# Altium footprint library CUSTOM PCB.PcbLib: 404 footprints (part 2 of 26)
Each footprint in its own frame and in the unit in brackets; x right, y up, seen from the top. Pads: shape width x height; smd on the part's side, far side on the other; paste and mask are expansions set on the pad; w line width, h text height; cw(c..) or ccw(c..) is an arc to the next point about the centre after c.
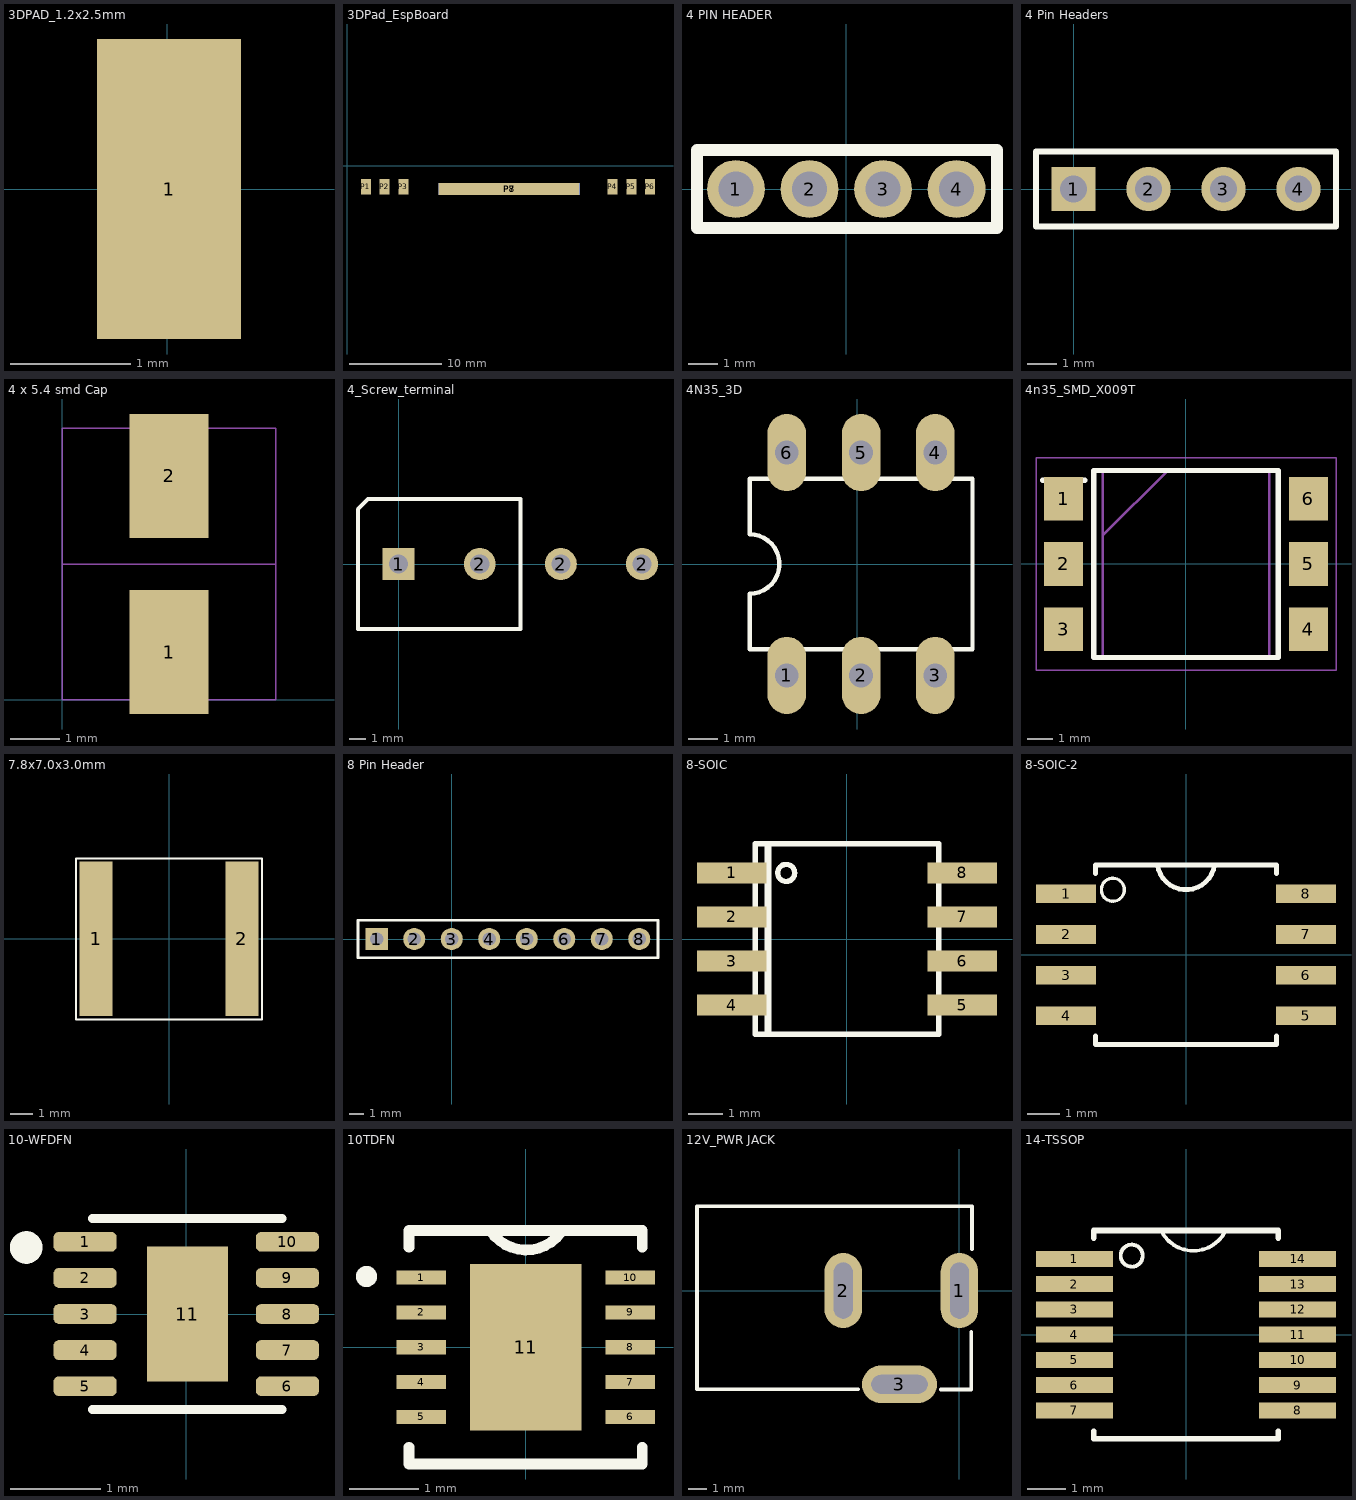
[diagram p1: the footprints below, top view; thin cyan lines are the x and y axes]

## 3DPAD_1.2x2.5mm [mm] "3D PAD_1.2x2.5mm"
pads (1):
  rect 1.2x2.5 smd: 1(0.015,0)

## 3DPad_EspBoard [mil]
pads (8):
  rect 43.31x66.93 smd: P1(80,-90) P2(160,-90) P3(240,-90) P4(1130,-90) P5(1210,-90) P6(1290,-90)
  rect 600x50 smd far side: P7(690,-100)
  rect 600x50 smd: P8(690,-100)
3D body: height 5, standoff 0, extent 380,-130 1000,-70
3D body: height 5, standoff 0, extent 210,-130 270,-50
3D body: height 5, standoff 0, extent 1260,-130 1320,-50
3D body: height 5, standoff 0, extent 1180,-130 1240,-50
3D body: height 5, standoff 0, extent 1100,-130 1160,-50
3D body: height 5, standoff 0, extent 130,-130 190,-50
3D body: height 5, standoff 0, extent 50,-130 110,-50
3D body: height 5, standoff 0, extent 380,-130 1000,-70
3D body: height 5, standoff 0, extent 380,-130 1000,-70

## 4 PIN HEADER [mm]
pads (4):
  round 2 hole 1.2: 1(-3.81,0) 2(-1.27,0) 3(1.27,0) 4(3.81,0)
Top Overlay:
  lines w0.4: -5.156,-1.346 5.207,-1.346 5.207,1.346 -5.156,1.346 -5.156,-1.346

## 4 Pin Headers [mm] "2.54"
pads (4):
  rect 1.5x1.5 hole 0.9: 1(0,0)
  round 1.5 hole 0.9: 2(2.54,0) 3(5.08,0) 4(7.62,0)
Top Overlay:
  lines w0.2: -1.27,-1.27 -1.27,1.27 8.89,1.27 8.89,-1.27 -1.27,-1.27
3D body "User Library-2PIN.SLDPRT": height 8, standoff -3, extent 3.81,-1.27 8.89,1.27
3D body "User Library-2PIN.SLDPRT": height 8, standoff -3, extent -1.27,-1.27 3.81,1.27

## 4 x 5.4 smd Cap [mm] "SMD_Polar_Cap"
pads (2):
  rect 1.6x2.5 smd: 1(2.159,0.965) 2(2.159,4.521)
Mechanical 4:
  lines w0.025: 0,2.743 4.318,2.743 ; 0,0 4.318,0 4.318,5.486 0,5.486 0,0
3D body "User Library-4x5_4.STEP": height 5.7, standoff 0, extent 0.035,0.068 4.335,5.368

## 4_Screw_terminal [mm]
pads (4):
  rect 2x2 hole 1.2: 1(0,0)
  round 2 hole 1.2: 2(5.08,0) 2(10.16,0) 2(15.24,0)
Top Overlay:
  lines w0.254: -2.54,-4.064 -2.54,3.429 -1.905,4.064 7.62,4.064 7.62,-4.064 -2.54,-4.064
3D body: height 0.25, standoff 0, extent 2.54,0 2.54,0

## 4N35_3D [mil] "4n35 including 3d model"
pads (6):
  oval 52x104 hole 32: 1(-95,-150) 2(5,-150) 3(105,-150) 4(105,150) 5(5,150) 6(-95,150)
Top Overlay:
  lines w6: -145,-115 155,-115 155,115 -145,115 -145,40 cw(c-145,0) -145,-40 -145,-115
3D body "4n35_3d_model.STEP": height 140.46, standoff -161.21, extent -164.28,-155 174.3,145
3D body: height 10, standoff 0, extent 5,0 5,0
3D body: height 10, standoff 0, extent 5,0 5,0
3D body: height 10, standoff 0, extent -295,-50 -295,-50
3D body: height 10, standoff 0, extent -295,-50 -295,-50
3D body: height 10, standoff 0, extent 5,150 5,150
3D body: height 10, standoff 0, extent -315,230 -315,230

## 4n35_SMD_X009T [mm]
pads (6):
  rect 1.52x1.7 smd: 1(-4.775,2.54) 2(-4.775,0) 3(-4.775,-2.54) 4(4.775,-2.54) 5(4.775,0) 6(4.775,2.54)
Top Overlay:
  lines w0.2: -5.6,3.265 -3.95,3.265 ; -3.6,-3.65 3.6,-3.65 3.6,3.65 -3.6,3.65 -3.6,-3.65
Mechanical 15:
  lines w0.1: -3.25,1.11 -0.71,3.65 ; -3.25,-3.65 3.25,-3.65 3.25,3.65 -3.25,3.65 -3.25,-3.65
Mechanical 20:
  lines w0.05: -5.85,-4.15 5.85,-4.15 5.85,4.15 -5.85,4.15 -5.85,-4.15
3D body "4N35-X009T.stp": height 3.8, standoff 0, extent -5.08,-3.65 5.08,3.65

## 7.8x7.0x3.0mm [mm]
pads (2):
  rect 1.5x7 smd: 1(-3.3,0) 2(3.3,0)
Top Overlay:
  lines w0.102: -4.216,-3.658 -4.216,3.632 4.216,3.632 4.216,-3.658 -4.216,-3.658
3D body: height 3, standoff 0, extent 2.515,-3.505 3.9,3.5
3D body: height 3, standoff 0, extent -3.9,-3.505 -2.514,3.5
3D body: height 2.8, standoff 0.2, extent -3.9,-3.493 3.899,3.493

## 8 Pin Header [mm] "2.54mm Pitch"
pads (8):
  rect 1.5x1.5 hole 0.9: 1(-5.08,0)
  round 1.5 hole 0.9: 2(-2.54,0) 3(0,0) 4(2.54,0) 5(5.08,0) 6(7.62,0) 7(10.16,0) 8(12.7,0)
Top Overlay:
  lines w0.2: -6.35,-1.27 13.97,-1.27 13.97,1.27 -6.35,1.27 -6.35,-1.27
3D body "User Library-2PIN.SLDPRT": height 8, standoff -3, extent -6.35,-1.346 -1.27,1.194
3D body "User Library-2PIN.SLDPRT": height 8, standoff -3, extent -1.27,-1.346 3.81,1.194
3D body "User Library-2PIN.SLDPRT": height 8, standoff -3, extent 3.81,-1.346 8.89,1.194
3D body "User Library-2PIN.SLDPRT": height 8, standoff -3, extent 8.89,-1.346 13.97,1.194

## 8-SOIC [mm]
pads (8):
  rect 2x0.6 smd: 1(-3.322,1.905) 2(-3.322,0.635) 3(-3.322,-0.635) 4(-3.322,-1.905) 5(3.322,-1.905) 6(3.322,-0.635) 7(3.322,0.635) 8(3.322,1.905)
Top Overlay:
  circle w0.15: c-1.753,1.905 r0.246
  lines w0.15: -2.645,-2.745 2.645,-2.745 2.645,2.745 -2.645,2.745 -2.645,-2.745
  lines w0.2: -2.271,-2.713 -2.271,2.718
3D body "8SIOC.stp": height 1.9, standoff -0.05, extent -3.099,-2.502 3.099,2.502

## 8-SOIC-2 [mil]
pads (8):
  rect 74x23 smd paste+0 mask+0: 1(-147.5,75) 2(-147.5,25) 3(-147.5,-25) 4(-147.5,-75) 5(147.5,-75) 6(147.5,-25) 7(147.5,25) 8(147.5,75)
Top Overlay:
  circle w3.94: c-90,80 r14.14
  lines w6: -111.5,-99.6 -111.5,-110.5 111.5,-110.5 111.5,-99.6 ; -111.5,99.6 -111.5,110.5 111.5,110.5 111.5,99.6 ; -35,110 ccw(c0,115.42) 35,110
3D body "8S2-M.step": height 82.16, standoff -3, extent -162.52,-105.51 162.52,105.51

## 10-WFDFN [mm]
pads (11):
  rrect55% 0.7x0.22 smd: 1(-1.121,0.8) 2(-1.121,0.4) 3(-1.121,0) 4(-1.121,-0.4) 5(-1.121,-0.8) 6(1.121,-0.8) 7(1.121,-0.4) 8(1.121,0) 9(1.121,0.4) 10(1.121,0.8)
  rect 0.9x1.5 smd: 11(0.013,0)
Top Overlay:
  circle w0.2: c-1.774,0.737 r0.08
  lines w0.1: -1.037,-1.06 1.063,-1.06 ; -1.037,1.06 1.063,1.06
3D body "SON11P40_220X200X80L30X20T150X90.STEP": height 0.8, standoff 0, extent -1.037,-1.1 1.063,1.1

## 10TDFN [mil]
pads (11):
  rect 28x8 smd paste+0 mask+0: 1(-59,39.37) 2(-59,19.68) 3(-59,0) 4(-59,-19.68) 5(-59,-39.37) 6(59,-39.37) 7(59,-19.68) 8(59,0) 9(59,19.68) 10(59,39.37)
  rect 63x94 smd paste-46.5 mask+0: 11(0,0)
Top Overlay:
  lines w6: -89.26,37.09 cw(c-90,40) -87.88,37.88 ; -66,-56.47 -66,-66 66,-66 66,-56.47 ; -66,56.47 -66,66 66,66 66,56.47 ; -20,66 ccw(c0.35,79.31) 20,65
Top Paste:
  region: 31.5,47 -31.5,47 -31.5,-47 31.5,-47
3D body "21-0137I_T1033-1-M.step": height 29.09, standoff -3, extent -60.99,-60.99 60.99,60.99

## 12V_PWR JACK [mm] "2.5 mm DC female jack"
pads (3):
  oval 2x4 hole 1 slot 3 at 90 deg: 1(0,0) 2(-6.2,0)
  oval 4x2 hole 1 slot 3 at 0 deg: 3(-3.2,-5)
Top Overlay:
  lines w0.2: -5.4,-5.264 -13.999,-5.264 -13.999,4.5 0.666,4.5 0.666,2.2 ; -1,-5.273 0.631,-5.273 0.631,-2.2
3D body "CUI_PJ-050A.step": height 11, standoff -2.2, extent -13.876,-5.131 0.524,4.369

## 14-TSSOP [mil]
pads (14):
  rect 78x16 smd paste+0 mask+0: 1(-113,76.77) 2(-113,51.18) 3(-113,25.59) 4(-113,0) 5(-113,-25.59) 6(-113,-51.18) 7(-113,-76.77) 8(113,-76.77) 9(113,-51.18) 10(113,-25.59) 11(113,0) 12(113,25.59) 13(113,51.18) 14(113,76.77)
Top Overlay:
  circle w3.94: c-55,80 r11.18
  lines w3.94: -25,105 ccw(c7.5,121.25) 40,105
  lines w6: -93.5,-97.87 -93.5,-105.5 93.5,-105.5 93.5,-97.87 ; -93.5,97.87 -93.5,105.5 93.5,105.5 93.5,97.87
3D body "PW14-M.step": height 44.09, standoff -3, extent -130,-100.51 130,100.51